# Altium footprint library std-th.PcbLib: 245 footprints (part 11 of 16)
Each footprint in its own frame and in the unit in brackets; x right, y up, seen from the top. Pads: shape width x height; smd on the part's side, far side on the other; paste and mask are expansions set on the pad; w line width, h text height; cw(c..) or ccw(c..) is an arc to the next point about the centre after c.
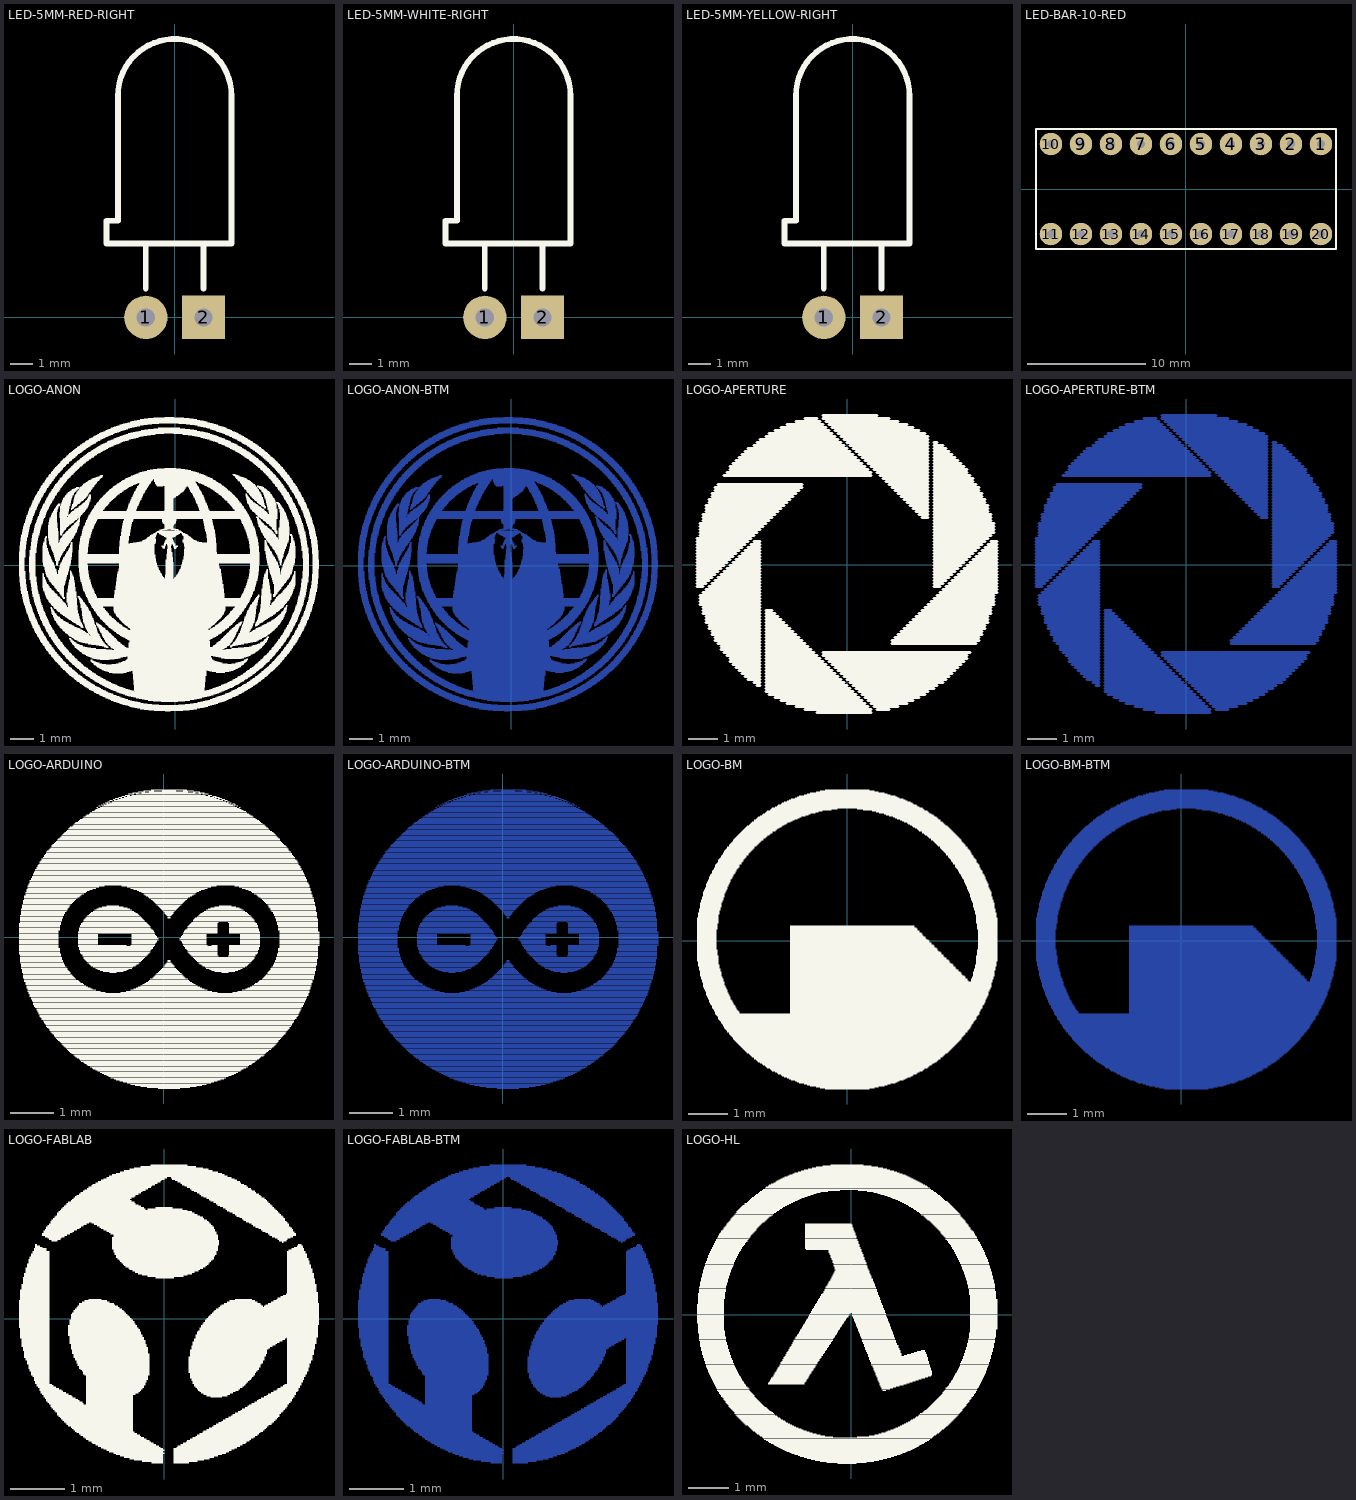
[diagram p10: the footprints below, top view; thin cyan lines are the x and y axes]

## LED-5MM-RED-RIGHT [mm] "LED, Red, 5 mm, 100 mil pitch, right angle"
height 6
pads (2):
  round 1.905 hole 0.8: 1(-1.27,0)
  rect 1.905x1.905 hole 0.8: 2(1.27,0)
Top Overlay:
  lines w0.254: -2.565,4.253 -3,4.253 -3,3.253 2.5,3.253 2.5,9.753 ccw(c0,9.753) -2.5,9.753 -2.5,4.253 ; -1.27,1.27 -1.27,3.253 ; 1.27,1.27 1.27,3.253
3D body: height 6.05, standoff -1.71, extent -3,-0.25 2.557,12.253

## LED-5MM-WHITE-RIGHT [mm] "LED, White, 5 mm, 100 mil pitch, right angle"
height 6
pads (2):
  round 1.905 hole 0.8: 1(-1.27,0)
  rect 1.905x1.905 hole 0.8: 2(1.27,0)
Top Overlay:
  lines w0.254: -2.565,4.253 -3,4.253 -3,3.253 2.5,3.253 2.5,9.753 ccw(c0,9.753) -2.5,9.753 -2.5,4.253 ; -1.27,1.27 -1.27,3.253 ; 1.27,1.27 1.27,3.253
3D body: height 6.05, standoff -1.71, extent -3,-0.25 2.557,12.253

## LED-5MM-YELLOW-RIGHT [mm] "LED, Yellow, 5 mm, 100 mil pitch, right angle"
height 6
pads (2):
  round 1.905 hole 0.8: 1(-1.27,0)
  rect 1.905x1.905 hole 0.8: 2(1.27,0)
Top Overlay:
  lines w0.254: -2.565,4.253 -3,4.253 -3,3.253 2.5,3.253 2.5,9.753 ccw(c0,9.753) -2.5,9.753 -2.5,4.253 ; -1.27,1.27 -1.27,3.253 ; 1.27,1.27 1.27,3.253
3D body: height 6.05, standoff -1.71, extent -3,-0.25 2.557,12.253

## LED-BAR-10-RED [mm] "LED Bar, 10 positions, 100 mil pitch"
height 10
pads (20):
  round 1.905 hole 0.7: 1(11.43,3.81) 2(8.89,3.81) 3(6.35,3.81) 4(3.81,3.81) 5(1.27,3.81) 6(-1.27,3.81) 7(-3.81,3.81) 8(-6.35,3.81) 9(-8.89,3.81) 10(-11.43,3.81) 11(-11.43,-3.81) 12(-8.89,-3.81) 13(-6.35,-3.81) 14(-3.81,-3.81) 15(-1.27,-3.81) 16(1.27,-3.81) 17(3.81,-3.81) 18(6.35,-3.81) 19(8.89,-3.81) 20(11.43,-3.81)
Top Overlay:
  lines w0.203: -12.7,-5.08 12.7,-5.08 12.7,5.08 -12.7,5.08 -12.7,-5.08
3D body: height 6.8, standoff -7, extent -12.7,-5.08 12.7,5.08

## LOGO-ANON [mil] "Anonymous Logo, 600 mil"
Top Overlay:
  drawing of 4671 lines, arcs and shapes, not listed

## LOGO-ANON-BTM [mil] "Anonymous Logo, 600 mil"
Bottom Layer:
  drawing of 4671 lines, arcs and shapes, not listed

## LOGO-APERTURE [mil] "Aperture Science Logo, 300 mil"
Top Overlay:
  drawing of 278 lines, arcs and shapes, not listed

## LOGO-APERTURE-BTM [mil] "Aperture Science Logo, 300 mil"
height 78.74
Bottom Layer:
  lines w4: -200,-29 -192,-29 ; -200,-25 -188,-25 ; -200,-21 -184,-21 ; -200,-17 -180,-17 ; -200,-13 -176,-13 ; -200,-9 -172,-9 ; -200,-5 -168,-5 ; -200,-1 -164,-1 ; -200,3 -160,3 ; -200,7 -156,7 ; -200,11 -152,11 ; -200,15 -148,15 ; -200,19 -144,19 ; -200,23 -140,23 ; -200,27 -136,27 ; -200,31 -132,31 ; -200,35 -128,35 ; -196,-53 -116,-53 ; -196,-49 -116,-49 ; -196,-45 -116,-45 ; -196,-41 -116,-41 ; -196,39 -124,39 ; -196,43 -120,43 ; -196,47 -116,47 ; -196,51 -112,51 ; -196,55 -108,55 ; -192,-65 -116,-65 ; -192,-61 -116,-61 ; -192,-57 -116,-57 ; -192,-37 -116,-37 ; -192,59 -104,59 ; -192,63 -100,63 ; -192,67 -96,67 ; -188,-77 -116,-77 ; -188,-73 -116,-73 ; -188,-69 -116,-69 ; -188,-33 -116,-33 ; -188,71 -92,71 ; -188,75 -88,75 ; -188,79 -84,79 ; -184,-85 -116,-85 ; -184,-81 -116,-81 ; -184,-29 -116,-29 ; -184,83 -80,83 ; -184,87 -76,87 ; -180,-93 -116,-93 ; -180,-89 -116,-89 ; -180,-25 -116,-25 ; -180,91 -72,91 ; -180,95 -68,95 ; -176,-101 -116,-101 ; -176,-97 -116,-97 ; -176,-21 -116,-21 ; -176,99 -64,99 ; -176,103 -60,103 ; -172,-105 -116,-105 ; -172,-17 -116,-17 ; -172,107 -60,107 ; -168,-113 -116,-113 ; -168,-109 -116,-109 ; -168,-13 -116,-13 ; -164,-117 -116,-117 ; -164,-9 -116,-9 ; -164,119 32,119 ; -160,-121 -116,-121 ; -160,-5 -116,-5 ; -160,123 32,123 ; -156,-129 -116,-129 ; -156,-125 -116,-125 ; -156,-1 -116,-1 ; -156,127 28,127 ; -156,131 24,131 ; -152,-133 -116,-133 ; -152,3 -116,3 ; -152,135 20,135 ; -148,-137 -116,-137 ; -148,7 -116,7 ; -148,139 16,139 ; -144,-141 -116,-141 ; -144,11 -116,11 ; -144,143 12,143 ; -140,-145 -116,-145 ; -140,15 -116,15 ; -140,147 8,147 ; -136,-149 -116,-149 ; -136,19 -116,19 ; -136,151 4,151 ; -132,-153 -116,-153 ; -132,23 -116,23 ; -132,155 0,155 ; -128,27 -116,27 ; -124,-157 -116,-157 ; -124,31 -116,31 ; -124,159 -4,159 ; -120,-161 -116,-161 ; -120,163 -8,163 ; -116,167 -12,167 ; -108,-169 8,-169 ; -108,-165 4,-165 ; -108,-161 0,-161 ; -108,-157 -4,-157 ; -108,-153 -8,-153 ; -108,-149 -12,-149 ; -108,-145 -16,-145 ; -108,-141 -20,-141 ; -108,-137 -24,-137 ; -108,-133 -28,-133 ; -108,-129 -32,-129 ; -108,-125 -36,-125 ; -108,-121 -40,-121 ; -108,-117 -44,-117 ; -108,-113 -48,-113 ; -108,-109 -52,-109 ; -108,-105 -56,-105 ; -108,-101 -60,-101 ; -108,-97 -64,-97 ; -108,-93 -68,-93 ; -108,-89 -72,-89 ; -108,-85 -76,-85 ; -108,-81 -80,-81 ; -108,-77 -84,-77 ; -108,-73 -88,-73 ; -108,-69 -92,-69 ; -108,-65 -96,-65 ; -108,-61 -100,-61 ; -108,171 -16,171 ; -104,-173 12,-173 ; -104,175 -20,175 ; -96,-177 16,-177 ; -96,179 -24,179 ; -88,-181 20,-181 ; -88,183 -28,183 ; -80,-185 24,-185 ; -80,187 -32,187 ; -68,-189 28,-189 ; -68,191 -36,191 ; -56,-193 32,-193 ; -56,195 -40,195 ; -40,-197 32,-197 ; -32,-121 160,-121 ; -32,-117 164,-117 ; -32,195 56,195 ; -32,199 40,199 ; -28,-125 160,-125 ; -28,191 68,191 ; -24,-129 156,-129 ; -24,187 80,187 ; -20,-133 152,-133 ; -20,183 88,183 ; -16,-137 148,-137 ; -16,179 96,179 ; -12,-141 144,-141 ; -12,175 104,175 ; -8,-145 140,-145 ; -8,171 108,171 ; -4,-149 136,-149 ; -4,167 108,167 ; 0,-153 132,-153 ; 0,163 108,163 ; 4,-157 128,-157 ; 4,159 108,159 ; 8,-161 120,-161 ; 8,155 108,155 ; 12,-165 116,-165 ; 12,151 108,151 ; 16,-169 108,-169 ; 16,147 108,147 ; 20,-173 104,-173 ; 20,143 108,143 ; 24,-177 96,-177 ; 24,139 108,139 ; 28,-181 88,-181 ; 28,135 108,135 ; 32,-185 80,-185 ; 32,131 108,131 ; 36,-189 68,-189 ; 36,127 108,127 ; 40,-193 56,-193 ; 40,123 108,123 ; 44,119 108,119 ; 48,115 108,115 ; 52,111 108,111 ; 56,107 108,107 ; 60,-105 172,-105 ; 60,-101 176,-101 ; 60,103 108,103 ; 64,-97 176,-97 ; 64,99 108,99 ; 68,-93 180,-93 ; 68,95 108,95 ; 72,-89 180,-89 ; 72,91 108,91 ; 76,-85 184,-85 ; 76,87 108,87 ; 80,-81 184,-81 ; 80,83 108,83 ; 84,-77 188,-77 ; 84,79 108,79 ; 88,-73 188,-73 ; 88,75 108,75 ; 92,-69 188,-69 ; 92,71 108,71 ; 96,-65 192,-65 ; 96,67 108,67 ; 100,-61 192,-61 ; 100,63 108,63 ; 104,-57 192,-57 ; 108,-53 196,-53 ; 112,-49 196,-49 ; 116,-45 196,-45 ; 116,-29 124,-29 ; 116,-25 128,-25 ; 116,-21 132,-21 ; 116,-17 136,-17 ; 116,-13 140,-13 ; 116,-9 144,-9 ; 116,-5 148,-5 ; 116,-1 152,-1 ; 116,3 156,3 ; 116,7 160,7 ; 116,11 164,11 ; 116,15 168,15 ; 116,19 172,19 ; 116,23 176,23 ; 116,27 180,27 ; 116,31 184,31 ; 116,35 188,35 ; 116,39 192,39 ; 116,43 196,43 ; 116,47 196,47 ; 116,51 196,51 ; 116,55 196,55 ; 116,59 192,59 ; 116,63 192,63 ; 116,67 192,67 ; 116,71 188,71 ; 116,75 188,75 ; 116,79 188,79 ; 116,83 184,83 ; 116,87 184,87 ; 116,91 180,91 ; 116,95 180,95 ; 116,99 176,99 ; 116,103 176,103 ; 116,107 172,107 ; 116,111 168,111 ; 116,115 168,115 ; 116,119 164,119 ; 116,123 160,123 ; 116,127 160,127 ; 116,131 156,131 ; 116,135 152,135 ; 116,139 148,139 ; 116,143 144,143 ; 116,147 140,147 ; 116,151 136,151 ; 116,155 132,155 ; 116,159 128,159 ; 116,163 120,163 ; 120,-41 196,-41 ; 124,-37 200,-37 ; 128,-33 200,-33 ; 132,-29 200,-29 ; 136,-25 200,-25 ; 140,-21 200,-21 ; 144,-17 200,-17 ; 148,-13 200,-13 ; 152,-9 200,-9 ; 156,-5 200,-5 ; 160,-1 200,-1 ; 164,3 200,3 ; 168,7 200,7 ; 172,11 200,11 ; 176,15 200,15 ; 180,19 200,19 ; 184,23 200,23 ; 188,27 200,27 ; 192,31 200,31

## LOGO-ARDUINO [mil] "Arduino Logo, 300 mil"
Top Overlay:
  drawing of 632 lines, arcs and shapes, not listed

## LOGO-ARDUINO-BTM [mil] "Arduino Logo, 300 mil"
Bottom Layer:
  lines w1: -132,-15 -94,-15 ; -132,-14 -95,-14 ; -132,-13 -95,-13 ; -132,-12 -95,-12 ; -132,-11 -95,-11 ; -132,-10 -95,-10 ; -132,-9 -96,-9 ; -132,-8 -96,-8 ; -132,-7 -96,-7 ; -132,-6 -96,-6 ; -132,-5 -96,-5 ; -132,-4 -96,-4 ; -132,-3 -96,-3 ; -132,-2 -96,-2 ; -132,-1 -96,-1 ; -132,0 -96,0 ; -132,1 -96,1 ; -132,2 -96,2 ; -132,3 -96,3 ; -132,4 -96,4 ; -132,5 -96,5 ; -132,6 -96,6 ; -132,7 -95,7 ; -132,8 -95,8 ; -132,9 -95,9 ; -132,10 -95,10 ; -132,11 -95,11 ; -132,12 -94,12 ; -132,13 -94,13 ; -131,-23 -91,-23 ; -131,-22 -92,-22 ; -131,-21 -92,-21 ; -131,-20 -93,-20 ; -131,-19 -93,-19 ; -131,-18 -93,-18 ; -131,-17 -94,-17 ; -131,-16 -94,-16 ; -131,14 -94,14 ; -131,15 -93,15 ; -131,16 -93,16 ; -131,17 -93,17 ; -131,18 -92,18 ; -131,19 -92,19 ; -131,20 -91,20 ; -130,-28 -88,-28 ; -130,-27 -89,-27 ; -130,-26 -90,-26 ; -130,-25 -90,-25 ; -130,-24 -91,-24 ; -130,21 -91,21 ; -130,22 -90,22 ; -130,23 -90,23 ; -130,24 -89,24 ; -130,25 -88,25 ; -130,26 -88,26 ; -129,-32 -85,-32 ; -129,-31 -86,-31 ; -129,-30 -87,-30 ; -129,-29 -88,-29 ; -129,27 -87,27 ; -129,28 -86,28 ; -129,29 -86,29 ; -129,30 -85,30 ; -128,-37 -81,-37 ; -128,-36 -82,-36 ; -128,-35 -83,-35 ; -128,-34 -84,-34 ; -128,-33 -85,-33 ; -128,31 -84,31 ; -128,32 -83,32 ; -128,33 -82,33 ; -128,34 -81,34 ; -127,-40 -77,-40 ; -127,-39 -78,-39 ; -127,-38 -80,-38 ; -127,35 -80,35 ; -127,36 -79,36 ; -127,37 -77,37 ; -127,38 -76,38 ; -126,-43 -73,-43 ; -126,-42 -74,-42 ; -126,-41 -76,-41 ; -126,39 -75,39 ; -126,40 -73,40 ; -126,41 -71,41 ; -125,-46 -67,-46 ; -125,-45 -69,-45 ; -125,-44 -71,-44 ; -125,42 -70,42 ; -125,43 -68,43 ; -125,44 -65,44 ; -124,-49 -58,-49 ; -124,-48 -62,-48 ; -124,-47 -65,-47 ; -124,45 -62,45 ; -124,46 -59,46 ; -124,47 -54,47 ; -123,-51 132,-51 ; -123,-50 -53,-50 ; -123,48 133,48 ; -123,49 132,49 ; -122,-54 131,-54 ; -122,-53 132,-53 ; -122,-52 132,-52 ; -122,50 132,50 ; -122,51 131,51 ; -122,52 131,52 ; -121,-56 130,-56 ; -121,-55 131,-55 ; -121,53 131,53 ; -121,54 130,54 ; -120,-58 129,-58 ; -120,-57 130,-57 ; -120,55 130,55 ; -120,56 129,56 ; -119,-61 128,-61 ; -119,-60 128,-60 ; -119,-59 129,-59 ; -119,57 129,57 ; -119,58 128,58 ; -118,-63 127,-63 ; -118,-62 127,-62 ; -118,59 128,59 ; -118,60 127,60 ; -117,-64 126,-64 ; -117,61 127,61 ; -117,62 126,62 ; -116,-66 125,-66 ; -116,-65 126,-65 ; -116,63 126,63 ; -116,64 125,64 ; -115,-68 124,-68 ; -115,-67 125,-67 ; -115,65 125,65 ; -115,66 124,66 ; -114,-70 123,-70 ; -114,-69 124,-69 ; -114,67 123,67 ; -113,-72 122,-72 ; -113,-71 123,-71 ; -113,68 123,68 ; -113,69 122,69 ; -112,-73 121,-73 ; -112,70 122,70 ; -111,-75 120,-75 ; -111,-74 121,-74 ; -111,71 121,71 ; -111,72 120,72 ; -110,-76 119,-76 ; -110,73 120,73 ; -109,-78 118,-78 ; -109,-77 119,-77 ; -109,74 119,74 ; -109,75 118,75 ; -108,-79 117,-79 ; -108,76 117,76 ; -107,-81 116,-81 ; -107,-80 117,-80 ; -107,77 117,77 ; -107,78 116,78 ; -106,-82 115,-82 ; -106,79 115,79 ; -105,-83 115,-83 ; -105,80 114,80 ; -104,-85 113,-85 ; -104,-84 114,-84 ; -104,81 114,81 ; -103,-86 112,-86 ; -103,82 113,82 ; -102,-87 111,-87 ; -102,83 112,83 ; -102,84 111,84 ; -101,-88 111,-88 ; -101,85 110,85 ; -100,-90 109,-90 ; -100,-89 110,-89 ; -100,86 109,86 ; -99,-91 108,-91 ; -99,87 108,87 ; -98,-92 107,-92 ; -98,88 107,88 ; -97,-93 106,-93 ; -97,89 106,89 ; -96,-94 105,-94 ; -96,90 106,90 ; -95,-95 105,-95 ; -95,91 105,91 ; -94,-96 104,-96 ; -94,92 104,92 ; -93,-97 103,-97 ; -93,93 103,93 ; -92,-98 102,-98 ; -92,94 102,94 ; -91,-99 101,-99 ; -91,95 101,95 ; -90,-100 100,-100 ; -90,96 100,96 ; -89,-101 99,-101 ; -89,97 99,97 ; -88,-102 98,-102 ; -88,98 97,98 ; -87,-103 96,-103 ; -87,99 96,99 ; -86,-104 95,-104 ; -86,100 95,100 ; -85,-105 94,-105 ; -85,101 94,101 ; -84,-106 93,-106 ; -83,102 93,102 ; -82,-107 92,-107 ; -82,103 92,103 ; -81,-108 91,-108 ; -81,104 90,104 ; -80,-109 89,-109 ; -80,105 89,105 ; -79,-110 88,-110 ; -78,-8 -9,-8 ; -78,-7 -34,-7 ; -78,-6 -60,-6 ; -78,-5 -60,-5 ; -78,-4 -60,-4 ; -78,-3 -60,-3 ; -78,-2 -60,-2 ; -78,-1 -60,-1 ; -78,0 -60,0 ; -78,1 -60,1 ; -78,2 -60,2 ; -78,3 -60,3 ; -78,4 -8,4 ; -78,5 -9,5 ; -78,106 88,106 ; -77,-111 87,-111 ; -77,-11 -11,-11 ; -77,-10 -10,-10 ; -77,-9 -10,-9 ; -77,6 -9,6 ; -77,7 -10,7 ; -77,8 -11,8 ; -77,9 -12,9 ; -77,107 87,107 ; -76,-112 85,-112 ; -76,-14 -13,-14 ; -76,-13 -12,-13 ; -76,-12 -12,-12 ; -76,10 -12,10 ; -76,11 -13,11 ; -76,108 85,108 ; -75,-113 84,-113 ; -75,-15 -14,-15 ; -75,12 -14,12 ; -75,13 -15,13 ; -74,-17 -16,-17 ; -74,-16 -15,-16 ; -74,14 -16,14 ; -74,109 84,109 ; -73,-114 83,-114 ; -73,-19 -18,-19 ; -73,-18 -17,-18 ; -73,15 -17,15 ; -73,16 -18,16 ; -73,110 82,110 ; -72,-115 81,-115 ; -72,-20 -19,-20 ; -72,17 -19,17 ; -71,-21 -20,-21 ; -71,18 -20,18 ; -71,111 81,111 ; -70,-116 80,-116 ; -70,-22 -21,-22 ; -70,19 -21,19 ; -70,112 79,112 ; -69,-117 78,-117 ; -69,-23 -22,-23 ; -69,20 -22,20 ; -68,-24 -23,-24 ; -68,21 -23,21 ; -68,113 78,113 ; -67,-118 77,-118 ; -67,-25 -25,-25 ; -67,22 -24,22 ; -67,114 76,114 ; -66,-26 -26,-26 ; -66,23 -26,23 ; -65,-119 75,-119 ; -65,115 75,115 ; -64,-120 73,-120 ; -64,-27 -28,-27 ; -64,24 -27,24 ; -63,25 -29,25 ; -63,116 73,116 ; -62,-121 71,-121 ; -62,-28 -29,-28 ; -62,117 71,117 ; -61,26 -31,26 ; -61,119 -60,119 ; -60,-122 70,-122 ; -60,-29 -32,-29 ; -60,118 69,118 ; -59,27 -33,27 ; -59,120 -58,120 ; -58,-123 68,-123 ; -58,-30 -34,-30 ; -58,119 67,119 ; -57,121 -56,121 ; -56,-124 66,-124 ; -56,28 -37,28 ; -56,120 65,120 ; -55,-31 -37,-31 ; -55,122 -54,122 ; -54,-125 64,-125 ; -54,121 63,121 ; -53,123 -51,123 ; -52,-126 62,-126 ; -52,29 -41,29 ; -52,122 61,122 ; -51,124 -49,124 ; -50,-127 59,-127 ; -49,-32 -43,-32 ; -49,123 59,123 ; -49,125 -47,125 ; -48,-128 57,-128 ; -47,124 57,124 ; -46,126 -44,126 ; -45,-129 55,-129 ; -45,125 54,125 ; -44,127 -41,127 ; -43,-130 52,-130 ; -42,126 51,126 ; -41,128 -38,128 ; -40,-131 49,-131 ; -39,-50 49,-50 ; -39,127 48,127 ; -38,47 48,47 ; -38,129 -35,129 ; -37,-132 46,-132 ; -36,128 46,128 ; -35,130 -31,130 ; -34,-49 44,-49 ; -33,-133 43,-133 ; -33,46 43,46 ; -33,129 42,129 ; -32,131 -27,131 ; -30,-134 39,-134 ; -30,-48 40,-48 ; -30,-7 -8,-7 ; -30,45 40,45 ; -29,-6 -8,-6 ; -29,-5 -7,-5 ; -29,-4 -6,-4 ; -29,-3 -6,-3 ; -29,-2 -5,-2 ; -29,-1 -5,-1 ; -29,0 -6,0 ; -29,1 -6,1 ; -29,2 -7,2 ; -29,3 -8,3 ; -29,130 38,130 ; -28,132 -23,132 ; -27,-47 37,-47 ; -27,44 37,44 ; -26,-135 35,-135 ; -25,-46 35,-46 ; -25,131 34,131 ; -24,43 34,43 ; -23,-45 33,-45 ; -23,133 -17,133 ; -22,42 32,42 ; -21,-136 30,-136 ; -21,-44 31,-44 ; -20,41 30,41 ; -20,132 29,132 ; -19,-43 29,-43 ; -18,40 29,40 ; -18,134 -9,134 ; -17,-42 27,-42 ; -17,39 27,39 ; -16,-41 26,-41 ; -16,38 26,38 ; -15,-137 24,-137 ; -14,-40 24,-40 ; -14,37 24,37 ; -13,-39 23,-39 ; -13,36 22,36 ; -13,133 22,133 ; -12,-38 22,-38 ; -11,35 21,35 ; -11,135 21,135 ; -10,-37 20,-37 ; -10,34 20,34 ; -9,-36 19,-36 ; -9,33 19,33 ; -8,-35 18,-35 ; -8,32 18,32 ; -7,-34 17,-34 ; -7,31 17,31 ; -6,-33 16,-33 ; -6,30 16,30 ; -5,-138 15,-138 ; -5,-32 15,-32 ; -5,29 15,29 ; -4,-31 14,-31 ; -4,28 14,28 ; -3,-30 13,-30 ; -3,27 13,27 ; -2,-29 12,-29 ; -2,26 12,26 ; -1,-28 11,-28 ; -1,25 11,25 ; -1,134 11,134 ; 0,-27 10,-27 ; 0,24 10,24 ; 1,-26 10,-26 ; 1,-25 9,-25 ; 1,22 9,22 ; 1,23 9,23 ; 2,-24 8,-24 ; 2,21 8,21 ; 3,-23 7,-23 ; 3,20 7,20 ; 4,-22 6,-22 ; 4,-21 6,-21 ; 4,18 6,18 ; 4,19 6,19 ; 15,-2 39,-2 ; 15,-1 39,-1 ; 16,-3 39,-3 ; 16,0 39,0 ; 16,1 39,1 ; 17,-5 39,-5 ; 17,-4 39,-4 ; 17,2 39,2 ; 18,-7 40,-7 ; 18,-6 39,-6 ; 18,3 39,3 ; 18,4 49,4 ; 18,134 27,134 ; 19,-8 49,-8 ; 19,5 49,5 ; 19,6 49,6 ; 20,-10 49,-10 ; 20,-9 49,-9 ; 20,7 49,7 ; 21,-11 49,-11 ; 21,8 49,8 ; 22,-13 49,-13 ; 22,-12 49,-12 ; 22,9 49,9 ; 22,10 49,10 ; 23,-14 49,-14 ; 23,11 49,11 ; 24,-15 49,-15 ; 24,12 49,12 ; 25,-16 49,-16 ; 25,13 49,13 ; 26,-17 50,-17 ; 26,14 50,14 ; 27,-18 83,-18 ; 27,15 83,15 ; 27,16 83,16 ; 27,133 33,133 ; 28,-19 83,-19 ; 28,17 82,17 ; 29,-20 82,-20 ; 29,18 81,18 ; 30,-21 81,-21 ; 31,-22 80,-22 ; 31,19 80,19 ; 32,-23 79,-23 ; 32,20 79,20 ; 32,132 37,132 ; 33,-24 78,-24 ; 33,21 78,21 ; 34,22 77,22 ; 35,-25 77,-25 ; 36,-26 76,-26 ; 36,23 76,23 ; 36,131 41,131 ; 37,24 74,24 ; 38,-27 74,-27 ; 39,-28 72,-28 ; 39,25 73,25 ; 41,26 71,26 ; 41,130 44,130 ; 42,-29 70,-29 ; 43,27 69,27 ; 44,-30 68,-30 ; 44,-7 49,-7 ; 45,129 48,129 ; 47,-31 65,-31 ; 47,28 66,28 ; 47,128 51,128 ; 50,127 53,127 ; 51,29 62,29 ; 53,-32 59,-32 ; 53,126 56,126 ; 56,125 58,125 ; 58,124 60,124 ; 59,-17 84,-17 ; 59,14 84,14 ; 60,-16 84,-16 ; 60,-15 85,-15 ; 60,-14 86,-14 ; 60,-13 86,-13 ; 60,-12 86,-12 ; 60,-11 87,-11 ; 60,-10 87,-10 ; 60,-9 87,-9 ; 60,-8 88,-8 ; 60,-7 88,-7 ; 60,4 88,4 ; 60,5 88,5 ; 60,6 87,6 ; 60,7 87,7 ; 60,8 87,8 ; 60,9 86,9 ; 60,10 86,10 ; 60,11 86,11 ; 60,12 85,12 ; 60,13 85,13 ; 61,123 62,123 ; 63,-50 133,-50 ; 63,122 65,122 ; 65,47 133,47 ; 65,121 66,121 ; 67,120 68,120 ; 68,-49 133,-49 ; 69,46 133,46 ; 69,119 70,119 ; 70,-6 88,-6 ; 70,-5 88,-5 ; 70,-4 88,-4 ; 70,-3 88,-3 ; 70,-2 88,-2 ; 70,-1 88,-1 ; 70,0 88,0 ; 70,1 88,1 ; 70,2 88,2 ; 70,3 88,3 ; 72,-48 133,-48 ; 72,45 134,45 ; 75,-47 134,-47 ; 75,44 134,44 ; 77,-46 134,-46 ; 78,43 134,43 ; 79,-45 134,-45 ; 80,42 135,42 ; 81,-44 135,-44 ; 81,41 135,41 ; 83,-43 135,-43 ; 83,40 135,40 ; 84,-42 135,-42 ; 85,39 136,39 ; 86,-41 136,-41 ; 86,38 136,38 ; 87,-40 136,-40 ; 87,37 136,37 ; 88,-39 136,-39 ; 89,36 137,36 ; 90,-38 137,-38 ; 90,35 137,35 ; 91,-37 137,-37 ; 91,34 137,34 ; 92,-36 137,-36 ; 92,33 137,33 ; 93,-35 137,-35 ; 93,32 138,32 ; 94,-34 138,-34 ; 94,31 138,31 ; 95,-33 138,-33 ; 95,-32 138,-32 ; 95,30 138,30 ; 96,-31 138,-31 ; 96,28 139,28 ; 96,29 138,29 ; 97,-30 139,-30 ; 97,27 139,27 ; 98,-29 139,-29 ; 98,-28 139,-28 ; 98,25 139,25 ; 98,26 139,26 ; 99,-27 139,-27 ; 99,24 139,24 ; 100,-26 139,-26 ; 100,-25 140,-25 ; 100,22 140,22 ; 100,23 140,23 ; 101,-24 140,-24 ; 101,-23 140,-23 ; 101,20 140,20 ; 101,21 140,21 ; 102,-22 140,-22 ; 102,-21 140,-21 ; 102,18 140,18 ; 102,19 140,19 ; 103,-20 140,-20 ; 103,-19 141,-19 ; 103,-18 141,-18 ; 103,15 141,15 ; 103,16 141,16 ; 103,17 141,17 ; 104,-17 141,-17 ; 104,-16 141,-16 ; 104,-15 141,-15 ; 104,12 141,12 ; 104,13 141,13 ; 104,14 141,14 ; 105,-14 141,-14 ; 105,-13 141,-13 ; 105,-12 141,-12 ; 105,-11 141,-11 ; 105,-10 141,-10 ; 105,7 141,7 ; 105,8 141,8 ; 105,9 141,9 ; 105,10 141,10 ; 105,11 141,11 ; 106,-9 141,-9 ; 106,-8 141,-8 ; 106,-7 142,-7 ; 106,-6 142,-6 ; 106,-5 142,-5 ; 106,-4 142,-4 ; 106,-3 142,-3 ; 106,-2 142,-2 ; 106,-1 142,-1 ; 106,0 142,0 ; 106,1 142,1 ; 106,2 142,2 ; 106,3 142,3 ; 106,4 142,4 ; 106,5 142,5 ; 106,6 141,6

## LOGO-BM [mil] "Black Mesa Logo, 300 mil"
Top Overlay:
  drawing of 561 lines, arcs and shapes, not listed

## LOGO-BM-BTM [mil] "Black Mesa Logo, 300 mil"
Bottom Layer:
  lines w1: -145,-20 -124,-20 ; -145,-19 -124,-19 ; -145,-18 -124,-18 ; -145,-17 -124,-17 ; -145,-16 -124,-16 ; -145,-15 -124,-15 ; -145,-14 -125,-14 ; -145,-13 -125,-13 ; -145,-12 -125,-12 ; -145,-11 -125,-11 ; -145,-10 -125,-10 ; -145,-9 -125,-9 ; -145,-8 -126,-8 ; -145,-7 -126,-7 ; -145,-6 -126,-6 ; -145,-5 -126,-5 ; -145,-4 -126,-4 ; -145,-3 -126,-3 ; -145,-2 -126,-2 ; -145,-1 -126,-1 ; -145,0 -126,0 ; -145,1 -126,1 ; -145,2 -126,2 ; -145,3 -126,3 ; -145,4 -126,4 ; -145,5 -126,5 ; -145,6 -126,6 ; -145,7 -126,7 ; -145,8 -126,8 ; -145,9 -126,9 ; -145,10 -126,10 ; -145,11 -126,11 ; -145,12 -125,12 ; -145,13 -125,13 ; -145,14 -125,14 ; -145,15 -125,15 ; -145,16 -125,16 ; -145,17 -125,17 ; -145,18 -124,18 ; -145,19 -124,19 ; -145,20 -124,20 ; -145,21 -124,21 ; -145,22 -124,22 ; -145,23 -124,23 ; -144,-25 -123,-25 ; -144,-24 -123,-24 ; -144,-23 -124,-23 ; -144,-22 -124,-22 ; -144,-21 -124,-21 ; -144,24 -124,24 ; -144,25 -124,25 ; -144,26 -124,26 ; -144,27 -123,27 ; -144,28 -123,28 ; -143,-29 -122,-29 ; -143,-28 -122,-28 ; -143,-27 -123,-27 ; -143,-26 -123,-26 ; -143,29 -123,29 ; -143,30 -123,30 ; -143,31 -122,31 ; -143,32 -122,32 ; -142,-35 -121,-35 ; -142,-34 -121,-34 ; -142,-33 -121,-33 ; -142,-32 -121,-32 ; -142,-31 -121,-31 ; -142,-30 -122,-30 ; -142,33 -122,33 ; -142,34 -121,34 ; -142,35 -121,35 ; -142,36 -121,36 ; -142,37 -121,37 ; -142,38 -121,38 ; -141,-38 -119,-38 ; -141,-37 -120,-37 ; -141,-36 -120,-36 ; -141,39 -120,39 ; -141,40 -120,40 ; -141,41 -119,41 ; -140,-41 -118,-41 ; -140,-40 -119,-40 ; -140,-39 -119,-39 ; -140,42 -119,42 ; -140,43 -119,43 ; -140,44 -118,44 ; -139,-46 -117,-46 ; -139,-45 -117,-45 ; -139,-44 -118,-44 ; -139,-43 -118,-43 ; -139,-42 -118,-42 ; -139,45 -118,45 ; -139,46 -118,46 ; -139,47 -118,47 ; -139,48 -117,48 ; -139,49 -117,49 ; -138,-48 -116,-48 ; -138,-47 -116,-47 ; -138,50 -116,50 ; -138,51 -116,51 ; -137,-50 -115,-50 ; -137,-49 -115,-49 ; -137,52 -115,52 ; -137,53 -115,53 ; -136,-54 -113,-54 ; -136,-53 -114,-53 ; -136,-52 -114,-52 ; -136,-51 -115,-51 ; -136,54 -115,54 ; -136,55 -114,55 ; -136,56 -114,56 ; -136,57 -113,57 ; -135,-56 -112,-56 ; -135,-55 -113,-55 ; -135,58 -113,58 ; -135,59 -112,59 ; -134,-58 -112,-58 ; -134,-57 -112,-57 ; -134,60 -112,60 ; -134,61 -112,61 ; -133,-61 -110,-61 ; -133,-60 -110,-60 ; -133,-59 -111,-59 ; -133,62 -111,62 ; -133,63 -110,63 ; -133,64 -110,64 ; -132,-63 -109,-63 ; -132,-62 -109,-62 ; -132,65 -109,65 ; -132,66 -109,66 ; -131,-64 -108,-64 ; -131,67 -108,67 ; -130,-67 -106,-67 ; -130,-66 -107,-66 ; -130,-65 -107,-65 ; -130,68 -107,68 ; -130,69 -107,69 ; -130,70 -106,70 ; -129,-68 -106,-68 ; -129,71 -106,71 ; -128,-70 -104,-70 ; -128,-69 -105,-69 ; -128,72 -105,72 ; -128,73 -104,73 ; -127,-73 137,-73 ; -127,-72 -103,-72 ; -127,-71 -103,-71 ; -127,74 -103,74 ; -127,75 -103,75 ; -127,76 -103,76 ; -126,-74 136,-74 ; -126,77 -101,77 ; -125,-75 135,-75 ; -125,78 -101,78 ; -124,-78 134,-78 ; -124,-77 134,-77 ; -124,-76 134,-76 ; -124,79 -100,79 ; -124,80 -99,80 ; -124,81 -99,81 ; -123,-79 133,-79 ; -123,82 -98,82 ; -122,-80 132,-80 ; -122,83 -97,83 ; -121,-82 131,-82 ; -121,-81 131,-81 ; -121,84 -96,84 ; -121,85 -96,85 ; -120,-83 130,-83 ; -120,86 -94,86 ; -119,-85 129,-85 ; -119,-84 129,-84 ; -119,87 -94,87 ; -119,88 -93,88 ; -118,-87 128,-87 ; -118,-86 128,-86 ; -118,89 -92,89 ; -118,90 -91,90 ; -117,-88 127,-88 ; -117,91 -90,91 ; -116,-89 126,-89 ; -116,92 -89,92 ; -115,-91 125,-91 ; -115,-90 125,-90 ; -115,93 -88,93 ; -115,94 -88,94 ; -113,-93 123,-93 ; -113,-92 123,-92 ; -113,95 -86,95 ; -113,96 -85,96 ; -112,-94 122,-94 ; -112,97 -84,97 ; -111,-95 121,-95 ; -111,98 -83,98 ; -110,-96 120,-96 ; -110,99 -82,99 ; -109,-98 119,-98 ; -109,-97 119,-97 ; -109,100 -81,100 ; -109,101 -79,101 ; -108,-99 118,-99 ; -108,102 -79,102 ; -107,-100 117,-100 ; -107,103 -77,103 ; -106,-101 116,-101 ; -106,104 -76,104 ; -105,-102 115,-102 ; -105,105 -75,105 ; -104,-103 114,-103 ; -104,106 -73,106 ; -103,-104 113,-104 ; -103,107 -72,107 ; -102,-105 112,-105 ; -102,108 -70,108 ; -101,-106 111,-106 ; -101,109 -70,109 ; -100,-107 110,-107 ; -100,110 -67,110 ; -99,-108 109,-108 ; -99,111 -66,111 ; -98,-109 108,-109 ; -98,112 -65,112 ; -97,-110 107,-110 ; -97,113 -63,113 ; -96,-111 106,-111 ; -96,114 -61,114 ; -95,-112 105,-112 ; -95,115 -60,115 ; -93,-113 103,-113 ; -93,116 -58,116 ; -92,-114 102,-114 ; -92,117 -56,117 ; -91,-115 101,-115 ; -91,118 -55,118 ; -90,-116 100,-116 ; -90,119 -52,119 ; -88,-118 98,-118 ; -88,-117 98,-117 ; -88,120 -50,120 ; -88,121 -48,121 ; -86,-119 96,-119 ; -86,122 -45,122 ; -85,-120 95,-120 ; -85,123 -43,123 ; -84,-121 94,-121 ; -84,124 -41,124 ; -82,-122 92,-122 ; -82,125 -37,125 ; -80,-123 90,-123 ; -80,126 -34,126 ; -79,-124 89,-124 ; -79,127 -32,127 ; -77,-125 87,-125 ; -77,128 -27,128 ; -76,-126 86,-126 ; -76,129 -24,129 ; -75,-127 85,-127 ; -75,130 -20,130 ; -72,-128 82,-128 ; -72,131 -11,131 ; -71,-129 81,-129 ; -71,132 -5,132 ; -70,-130 80,-130 ; -70,133 80,133 ; -67,-131 77,-131 ; -67,134 77,134 ; -65,-132 75,-132 ; -65,135 75,135 ; -64,-133 74,-133 ; -64,136 74,136 ; -61,-134 71,-134 ; -61,137 71,137 ; -60,-135 70,-135 ; -60,138 70,138 ; -58,-136 68,-136 ; -58,139 68,139 ; -55,-137 65,-137 ; -55,140 65,140 ; -53,-138 63,-138 ; -53,141 63,141 ; -52,-72 137,-72 ; -52,-71 137,-71 ; -52,-70 138,-70 ; -52,-69 138,-69 ; -52,-68 139,-68 ; -52,-67 140,-67 ; -52,-66 140,-66 ; -52,-65 140,-65 ; -52,-64 141,-64 ; -52,-63 142,-63 ; -52,-62 142,-62 ; -52,-61 143,-61 ; -52,-60 143,-60 ; -52,-59 143,-59 ; -52,-58 144,-58 ; -52,-57 144,-57 ; -52,-56 145,-56 ; -52,-55 145,-55 ; -52,-54 146,-54 ; -52,-53 146,-53 ; -52,-52 146,-52 ; -52,-51 146,-51 ; -52,-50 147,-50 ; -52,-49 147,-49 ; -52,-48 148,-48 ; -52,-47 148,-47 ; -52,-46 149,-46 ; -52,-45 149,-45 ; -52,-44 149,-44 ; -52,-43 149,-43 ; -52,-42 149,-42 ; -52,-41 150,-41 ; -52,-40 126,-40 ; -52,-39 125,-39 ; -52,-38 125,-38 ; -52,-37 123,-37 ; -52,-36 123,-36 ; -52,-35 122,-35 ; -52,-34 120,-34 ; -52,-33 119,-33 ; -52,-32 119,-32 ; -52,-31 118,-31 ; -52,-30 116,-30 ; -52,-29 116,-29 ; -52,-28 114,-28 ; -52,-27 113,-27 ; -52,-26 113,-26 ; -52,-25 111,-25 ; -52,-24 111,-24 ; -52,-23 110,-23 ; -52,-22 108,-22 ; -52,-21 107,-21 ; -52,-20 107,-20 ; -52,-19 106,-19 ; -52,-18 104,-18 ; -52,-17 104,-17 ; -52,-16 102,-16 ; -52,-15 101,-15 ; -52,-14 101,-14 ; -52,-13 99,-13 ; -52,-12 99,-12 ; -52,-11 98,-11 ; -52,-10 96,-10 ; -52,-9 95,-9 ; -52,-8 95,-8 ; -52,-7 94,-7 ; -52,-6 92,-6 ; -52,-5 92,-5 ; -52,-4 91,-4 ; -52,-3 89,-3 ; -52,-2 89,-2 ; -52,-1 87,-1 ; -52,0 87,0 ; -52,1 86,1 ; -52,2 84,2 ; -52,3 83,3 ; -52,4 83,4 ; -52,5 81,5 ; -52,6 80,6 ; -52,7 80,7 ; -52,8 79,8 ; -52,9 77,9 ; -52,10 77,10 ; -52,11 75,11 ; -52,12 75,12 ; -52,13 74,13 ; -52,14 72,14 ; -52,15 72,15 ; -51,-139 61,-139 ; -51,142 61,142 ; -47,-140 57,-140 ; -47,143 57,143 ; -45,-141 55,-141 ; -45,144 55,144 ; -43,-142 53,-142 ; -43,145 53,145 ; -38,-143 48,-143 ; -38,146 48,146 ; -35,-144 45,-144 ; -35,147 45,147 ; -32,-145 42,-145 ; -32,148 42,148 ; -26,-146 36,-146 ; -26,149 36,149 ; -22,-147 32,-147 ; -22,150 32,150 ; -17,-148 27,-148 ; -17,151 27,151 ; 15,132 81,132 ; 21,131 82,131 ; 30,130 85,130 ; 34,129 86,129 ; 37,128 87,128 ; 42,127 89,127 ; 44,126 91,126 ; 47,125 92,125 ; 51,124 94,124 ; 53,123 95,123 ; 55,122 96,122 ; 58,121 98,121 ; 60,120 98,120 ; 62,119 100,119 ; 65,118 101,118 ; 66,117 102,117 ; 68,116 103,116 ; 70,115 105,115 ; 71,114 106,114 ; 73,113 107,113 ; 75,112 108,112 ; 76,111 109,111 ; 77,110 110,110 ; 80,108 112,108 ; 80,109 111,109 ; 82,107 113,107 ; 83,106 114,106 ; 85,105 115,105 ; 86,104 116,104 ; 87,103 117,103 ; 89,101 119,101 ; 89,102 118,102 ; 91,100 119,100 ; 92,99 120,99 ; 93,98 121,98 ; 94,97 122,97 ; 95,96 123,96 ; 96,95 123,95 ; 98,93 125,93 ; 98,94 125,94 ; 99,92 126,92 ; 100,91 127,91 ; 101,90 128,90 ; 102,89 128,89 ; 103,88 129,88 ; 104,86 130,86 ; 104,87 129,87 ; 106,84 131,84 ; 106,85 131,85 ; 107,83 132,83 ; 108,82 133,82 ; 109,80 134,80 ; 109,81 134,81 ; 110,79 134,79 ; 111,77 136,77 ; 111,78 135,78 ; 113,74 137,74 ; 113,75 137,75 ; 113,76 137,76 ; 114,73 138,73 ; 115,72 138,72 ; 116,70 140,70 ; 116,71 139,71 ; 117,68 140,68 ; 117,69 140,69 ; 118,67 141,67 ; 119,65 142,65 ; 119,66 142,66 ; 120,63 143,63 ; 120,64 143,64 ; 121,62 143,62 ; 122,59 145,59 ; 122,60 144,60 ; 122,61 144,61 ; 123,57 146,57 ; 123,58 145,58 ; 124,55 146,55 ; 124,56 146,56 ; 125,52 147,52 ; 125,53 147,53 ; 125,54 146,54 ; 126,50 148,50 ; 126,51 148,51 ; 127,48 149,48 ; 127,49 149,49 ; 128,44 150,44 ; 128,45 149,45 ; 128,46 149,46 ; 128,47 149,47 ; 129,-40 150,-40 ; 129,-39 150,-39 ; 129,-38 151,-38 ; 129,41 151,41 ; 129,42 150,42 ; 129,43 150,43 ; 130,-37 151,-37 ; 130,-36 151,-36 ; 130,39 151,39 ; 130,40 151,40 ; 131,-35 152,-35 ; 131,-34 152,-34 ; 131,-33 152,-33 ; 131,-32 152,-32 ; 131,-31 152,-31 ; 131,34 152,34 ; 131,35 152,35 ; 131,36 152,36 ; 131,37 152,37 ; 131,38 152,38 ; 132,-30 152,-30 ; 132,-29 153,-29 ; 132,-28 153,-28 ; 132,31 153,31 ; 132,32 153,32 ; 132,33 152,33 ; 133,-27 153,-27 ; 133,-26 153,-26 ; 133,-25 154,-25 ; 133,-24 154,-24 ; 133,27 154,27 ; 133,28 154,28 ; 133,29 153,29 ; 133,30 153,30 ; 134,-23 154,-23 ; 134,-22 154,-22 ; 134,-21 154,-21 ; 134,-20 155,-20 ; 134,-19 155,-19 ; 134,-18 155,-18 ; 134,-17 155,-17 ; 134,-16 155,-16 ; 134,-15 155,-15 ; 134,18 155,18 ; 134,19 155,19 ; 134,20 155,20 ; 134,21 155,21 ; 134,22 155,22 ; 134,23 155,23 ; 134,24 154,24 ; 134,25 154,25 ; 134,26 154,26 ; 135,-14 155,-14 ; 135,-13 155,-13 ; 135,-12 155,-12 ; 135,-11 155,-11 ; 135,-10 155,-10 ; 135,-9 155,-9 ; 135,12 155,12 ; 135,13 155,13 ; 135,14 155,14 ; 135,15 155,15 ; 135,16 155,16 ; 135,17 155,17 ; 136,-8 155,-8 ; 136,-7 155,-7 ; 136,-6 155,-6 ; 136,-5 155,-5 ; 136,-4 155,-4 ; 136,-3 155,-3 ; 136,-2 155,-2 ; 136,-1 155,-1 ; 136,0 155,0 ; 136,1 155,1 ; 136,2 155,2 ; 136,3 155,3 ; 136,4 155,4 ; 136,5 155,5 ; 136,6 155,6 ; 136,7 155,7 ; 136,8 155,8 ; 136,9 155,9 ; 136,10 155,10 ; 136,11 155,11

## LOGO-FABLAB [mil] "Fablab Logo, 225 mil"
Top Overlay:
  drawing of 594 lines, arcs and shapes, not listed

## LOGO-FABLAB-BTM [mil] "Fablab Logo, 225 mil"
Bottom Layer:
  lines w1: -106,-6 -84,-6 ; -106,-5 -84,-5 ; -106,-4 -84,-4 ; -106,-3 -84,-3 ; -106,-2 -84,-2 ; -106,-1 -84,-1 ; -106,0 -84,0 ; -106,1 -84,1 ; -106,2 -84,2 ; -106,3 -84,3 ; -106,4 -84,4 ; -106,5 -84,5 ; -106,6 -84,6 ; -106,7 -84,7 ; -106,8 -84,8 ; -106,9 -84,9 ; -106,10 -84,10 ; -106,11 -84,11 ; -106,12 -84,12 ; -106,13 -84,13 ; -105,-14 -84,-14 ; -105,-13 -84,-13 ; -105,-12 -84,-12 ; -105,-11 -84,-11 ; -105,-10 -84,-10 ; -105,-9 -84,-9 ; -105,-8 -84,-8 ; -105,-7 -84,-7 ; -105,14 -84,14 ; -105,15 -84,15 ; -105,16 -84,16 ; -105,17 -84,17 ; -105,18 -84,18 ; -105,19 -84,19 ; -105,20 -84,20 ; -105,21 -84,21 ; -104,-20 -84,-20 ; -104,-19 -84,-19 ; -104,-18 -84,-18 ; -104,-17 -84,-17 ; -104,-16 -84,-16 ; -104,-15 -84,-15 ; -104,22 -84,22 ; -104,23 -84,23 ; -104,24 -84,24 ; -104,25 -84,25 ; -103,-23 -84,-23 ; -103,-22 -84,-22 ; -103,-21 -84,-21 ; -103,26 -84,26 ; -103,27 -84,27 ; -103,28 -84,28 ; -103,29 -84,29 ; -103,30 -84,30 ; -102,-28 -84,-28 ; -102,-27 -84,-27 ; -102,-26 -84,-26 ; -102,-25 -84,-25 ; -102,-24 -84,-24 ; -102,31 -84,31 ; -102,32 -84,32 ; -102,33 -84,33 ; -101,-30 -84,-30 ; -101,-29 -84,-29 ; -101,34 -84,34 ; -101,35 -84,35 ; -101,36 -84,36 ; -101,37 -84,37 ; -100,-33 -84,-33 ; -100,-32 -84,-32 ; -100,-31 -84,-31 ; -100,38 -84,38 ; -100,39 -84,39 ; -100,40 -84,40 ; -99,-36 -84,-36 ; -99,-35 -84,-35 ; -99,-34 -84,-34 ; -99,41 -84,41 ; -99,42 -84,42 ; -99,43 -84,43 ; -98,-38 -84,-38 ; -98,-37 -84,-37 ; -98,44 -84,44 ; -98,45 -84,45 ; -97,-41 -84,-41 ; -97,-40 -84,-40 ; -97,-39 -84,-39 ; -97,46 -84,46 ; -97,47 -84,47 ; -96,-42 -84,-42 ; -96,48 -84,48 ; -96,49 -84,49 ; -95,-45 -84,-45 ; -95,-44 -84,-44 ; -95,-43 -84,-43 ; -95,50 -86,50 ; -95,51 -86,51 ; -94,-47 -84,-47 ; -94,-46 -84,-46 ; -94,52 -89,52 ; -94,53 -91,53 ; -94,54 -93,54 ; -93,-49 -81,-49 ; -93,-48 -82,-48 ; -92,-50 -79,-50 ; -91,-52 -75,-52 ; -91,-51 -77,-51 ; -90,-54 -72,-54 ; -90,-53 -74,-53 ; -89,-55 -70,-55 ; -89,61 -71,61 ; -89,62 -69,62 ; -88,-57 -67,-57 ; -88,-56 -68,-56 ; -88,63 -67,63 ; -88,64 -66,64 ; -87,-58 -65,-58 ; -87,60 -73,60 ; -87,65 -64,65 ; -86,-60 -62,-60 ; -86,-59 -63,-59 ; -86,66 -62,66 ; -86,67 -61,67 ; -85,-61 -60,-61 ; -85,59 -75,59 ; -85,68 -59,68 ; -84,-62 -59,-62 ; -84,58 -76,58 ; -84,69 -57,69 ; -83,-64 -23,-64 ; -83,-63 -23,-63 ; -83,70 -55,70 ; -83,71 32,71 ; -82,-65 -23,-65 ; -82,57 -78,57 ; -82,72 31,72 ; -81,-66 -23,-66 ; -81,73 29,73 ; -80,-67 -23,-67 ; -80,74 28,74 ; -79,-68 -23,-68 ; -79,75 26,75 ; -78,-70 -23,-70 ; -78,-69 -23,-69 ; -78,76 24,76 ; -78,77 22,77 ; -77,-71 -23,-71 ; -77,78 20,78 ; -76,-72 -23,-72 ; -76,79 17,79 ; -75,-73 -23,-73 ; -75,80 -14,80 ; -74,-74 -23,-74 ; -74,81 -15,81 ; -73,-75 -23,-75 ; -73,82 -17,82 ; -72,-76 -23,-76 ; -72,83 -19,83 ; -71,-77 -23,-77 ; -71,84 -21,84 ; -70,-78 -23,-78 ; -70,-12 -16,-12 ; -70,-11 -17,-11 ; -70,-10 -17,-10 ; -70,-9 -18,-9 ; -70,-8 -18,-8 ; -70,-7 -19,-7 ; -70,-6 -20,-6 ; -70,-5 -20,-5 ; -70,85 -22,85 ; -69,-18 -14,-18 ; -69,-17 -14,-17 ; -69,-16 -14,-16 ; -69,-15 -15,-15 ; -69,-14 -15,-14 ; -69,-13 -16,-13 ; -69,-4 -21,-4 ; -69,-3 -22,-3 ; -69,-2 -22,-2 ; -69,-1 -23,-1 ; -68,-79 -23,-79 ; -68,-22 -12,-22 ; -68,-21 -12,-21 ; -68,-20 -13,-20 ; -68,-19 -13,-19 ; -68,0 -24,0 ; -68,1 -25,1 ; -68,2 -26,2 ; -68,3 -27,3 ; -68,86 -24,86 ; -67,-80 -23,-80 ; -67,-25 -12,-25 ; -67,-24 -12,-24 ; -67,-23 -12,-23 ; -67,4 -28,4 ; -67,87 -25,87 ; -66,-81 -23,-81 ; -66,-28 -11,-28 ; -66,-27 -11,-27 ; -66,-26 -11,-26 ; -66,5 -29,5 ; -66,6 -30,6 ; -66,88 -24,88 ; -65,-82 -23,-82 ; -65,-30 -11,-30 ; -65,-29 -11,-29 ; -65,7 -31,7 ; -65,89 -22,89 ; -64,-83 -22,-83 ; -64,-32 -11,-32 ; -64,-31 -11,-31 ; -64,8 -33,8 ; -64,90 -21,90 ; -63,-34 -11,-34 ; -63,-33 -11,-33 ; -63,9 -34,9 ; -62,-84 -20,-84 ; -62,-36 -11,-36 ; -62,-35 -11,-35 ; -62,10 -36,10 ; -62,11 -37,11 ; -62,91 -19,91 ; -61,-85 -18,-85 ; -61,-37 -11,-37 ; -61,92 -17,92 ; -60,-38 -11,-38 ; -60,12 -40,12 ; -59,-86 -17,-86 ; -59,-40 -11,-40 ; -59,-39 -11,-39 ; -59,93 -16,93 ; -58,-87 -15,-87 ; -58,-41 -11,-41 ; -58,13 -42,13 ; -58,94 -14,94 ; -57,-88 -13,-88 ; -57,-62 -23,-62 ; -57,-61 -23,-61 ; -57,-60 -23,-60 ; -57,-59 -23,-59 ; -57,-58 -23,-58 ; -57,-57 -23,-57 ; -57,-56 -23,-56 ; -57,-55 -21,-55 ; -57,-54 -19,-54 ; -57,-53 -18,-53 ; -57,-52 -17,-52 ; -57,-51 -16,-51 ; -57,-50 -15,-50 ; -57,-49 -15,-49 ; -57,-48 -14,-48 ; -57,-47 -14,-47 ; -57,-46 -13,-46 ; -57,-45 -13,-45 ; -57,-44 -12,-44 ; -57,-43 -12,-43 ; -57,-42 -12,-42 ; -56,95 -12,95 ; -55,-89 -11,-89 ; -55,14 -46,14 ; -55,96 -10,96 ; -53,-90 -10,-90 ; -53,70 33,70 ; -53,97 -9,97 ; -52,-91 -8,-91 ; -52,98 -7,98 ; -51,69 34,69 ; -50,-92 -6,-92 ; -50,99 -5,99 ; -49,68 35,68 ; -48,-93 -4,-93 ; -48,100 -3,100 ; -47,67 36,67 ; -46,-94 -3,-94 ; -46,66 36,66 ; -46,101 -2,101 ; -44,-95 -1,-95 ; -44,65 37,65 ; -44,102 0,102 ; -42,-96 0,-96 ; -42,64 37,64 ; -42,103 2,103 ; -40,-97 -1,-97 ; -40,63 38,63 ; -40,104 46,104 ; -39,62 38,62 ; -38,51 39,51 ; -38,52 39,52 ; -38,53 39,53 ; -38,54 40,54 ; -38,55 40,55 ; -38,56 40,56 ; -38,57 40,57 ; -38,58 39,58 ; -38,59 39,59 ; -38,105 44,105 ; -37,-98 0,-98 ; -37,49 38,49 ; -37,50 39,50 ; -37,60 39,60 ; -37,61 39,61 ; -36,47 38,47 ; -36,48 38,48 ; -35,-99 -1,-99 ; -35,45 36,45 ; -35,46 37,46 ; -35,106 42,106 ; -34,44 36,44 ; -33,43 35,43 ; -32,-100 -1,-100 ; -32,42 34,42 ; -32,107 39,107 ; -31,41 33,41 ; -30,40 32,40 ; -29,-101 -1,-101 ; -29,39 31,39 ; -29,108 35,108 ; -28,38 30,38 ; -26,37 28,37 ; -25,-102 -1,-102 ; -25,36 26,36 ; -25,109 32,109 ; -23,35 25,35 ; -22,-103 -1,-103 ; -22,110 28,110 ; -21,34 22,34 ; -19,33 20,33 ; -17,111 23,111 ; -16,-104 -1,-104 ; -16,32 17,32 ; -12,31 14,31 ; -12,80 13,80 ; -10,112 17,112 ; -9,-105 -1,-105 ; -6,30 7,30 ; -6,81 6,81 ; 5,103 49,103 ; 6,102 51,102 ; 7,-105 18,-105 ; 7,-104 24,-104 ; 7,-103 29,-103 ; 7,-102 33,-102 ; 7,-101 36,-101 ; 7,-100 39,-100 ; 7,-99 42,-99 ; 7,-98 45,-98 ; 7,-97 47,-97 ; 7,-96 49,-96 ; 7,-95 51,-95 ; 8,101 53,101 ; 9,-94 53,-94 ; 10,-93 55,-93 ; 10,100 55,100 ; 12,-92 57,-92 ; 12,99 56,99 ; 13,98 58,98 ; 14,-91 59,-91 ; 15,97 60,97 ; 16,-90 60,-90 ; 17,-89 62,-89 ; 17,96 61,96 ; 18,-39 67,-39 ; 18,-38 68,-38 ; 18,-37 69,-37 ; 18,-36 69,-36 ; 18,-35 70,-35 ; 18,-34 70,-34 ; 18,-33 71,-33 ; 18,-32 72,-32 ; 18,-31 72,-31 ; 18,-30 73,-30 ; 18,-29 73,-29 ; 18,-28 73,-28 ; 19,-88 63,-88 ; 19,-43 64,-43 ; 19,-42 65,-42 ; 19,-41 66,-41 ; 19,-40 66,-40 ; 19,-27 74,-27 ; 19,-26 74,-26 ; 19,-25 75,-25 ; 19,-24 75,-24 ; 19,-23 75,-23 ; 19,95 63,95 ; 20,-45 62,-45 ; 20,-44 63,-44 ; 20,-22 76,-22 ; 20,-21 77,-21 ; 20,-20 79,-20 ; 20,94 64,94 ; 21,-87 65,-87 ; 21,-47 60,-47 ; 21,-46 61,-46 ; 21,-19 81,-19 ; 21,-18 82,-18 ; 21,-17 84,-17 ; 22,-49 58,-49 ; 22,-48 59,-48 ; 22,-16 86,-16 ; 22,-15 88,-15 ; 22,93 66,93 ; 23,-86 66,-86 ; 23,-50 57,-50 ; 23,-14 89,-14 ; 23,-13 112,-13 ; 23,-12 112,-12 ; 24,-85 68,-85 ; 24,-51 55,-51 ; 24,-11 112,-11 ; 24,-10 112,-10 ; 24,92 67,92 ; 25,-52 54,-52 ; 25,-9 112,-9 ; 26,-84 69,-84 ; 26,-53 52,-53 ; 26,-8 112,-8 ; 26,-7 112,-7 ; 26,91 69,91 ; 27,-54 50,-54 ; 27,-6 112,-6 ; 27,-5 112,-5 ; 27,90 70,90 ; 28,-83 70,-83 ; 28,-4 113,-4 ; 29,-82 72,-82 ; 29,-55 48,-55 ; 29,-3 113,-3 ; 29,89 71,89 ; 30,-2 113,-2 ; 30,-1 113,-1 ; 31,-81 73,-81 ; 31,-56 46,-56 ; 31,0 113,0 ; 31,88 73,88 ; 32,1 113,1 ; 33,-80 74,-80 ; 33,2 113,2 ; 33,87 74,87 ; 34,-57 42,-57 ; 34,3 113,3 ; 34,86 75,86 ; 35,-79 75,-79 ; 35,4 113,4 ; 36,-78 76,-78 ; 36,5 113,5 ; 36,85 76,85 ; 37,6 113,6 ; 38,-77 78,-77 ; 38,7 113,7 ; 38,84 77,84 ; 39,83 78,83 ; 40,-76 79,-76 ; 40,8 113,8 ; 41,9 72,9 ; 41,82 79,82 ; 42,-75 80,-75 ; 42,10 71,10 ; 43,-74 81,-74 ; 43,81 80,81 ; 44,11 70,11 ; 45,-73 82,-73 ; 45,80 81,80 ; 46,12 68,12 ; 46,79 82,79 ; 47,-72 83,-72 ; 48,13 66,13 ; 48,78 83,78 ; 49,-71 84,-71 ; 50,-70 84,-70 ; 50,77 84,77 ; 52,-69 85,-69 ; 52,14 64,14 ; 52,76 85,76 ; 53,75 86,75 ; 54,-68 86,-68 ; 55,74 87,74 ; 56,-67 87,-67 ; 57,-66 88,-66 ; 57,73 88,73 ; 58,72 88,72 ; 59,-65 89,-65 ; 60,71 89,71 ; 61,-64 90,-64 ; 62,-63 90,-63 ; 62,70 90,70 ; 64,-62 91,-62 ; 64,69 91,69 ; 65,68 91,68 ; 66,-61 92,-61 ; 67,67 92,67 ; 68,-60 93,-60 ; 69,-59 93,-59 ; 69,66 93,66 ; 71,-58 94,-58 ; 71,65 94,65 ; 72,64 94,64 ; 73,-57 95,-57 ; 73,9 113,9 ; 74,10 113,10 ; 74,63 95,63 ; 75,-56 95,-56 ; 76,-55 96,-55 ; 76,11 113,11 ; 76,62 96,62 ; 77,61 96,61 ; 78,-54 96,-54 ; 78,12 112,12 ; 79,60 94,60 ; 80,-53 97,-53 ; 80,13 112,13 ; 81,59 92,59 ; 82,-52 98,-52 ; 82,14 112,14 ; 83,-51 98,-51 ; 83,15 112,15 ; 83,58 90,58 ; 84,57 89,57 ; 85,-50 99,-50 ; 85,16 112,16 ; 86,56 87,56 ; 87,-49 99,-49 ; 87,17 112,17 ; 88,-48 100,-48 ; 89,18 112,18 ; 90,-47 100,-47 ; 90,-46 101,-46 ; 90,-45 101,-45 ; 90,-44 102,-44 ; 90,-43 102,-43 ; 90,-42 103,-42 ; 90,-41 103,-41 ; 90,-40 104,-40 ; 90,-39 104,-39 ; 90,-38 105,-38 ; 90,-37 105,-37 ; 90,-36 105,-36 ; 90,-35 106,-35 ; 90,-34 106,-34 ; 90,-33 106,-33 ; 90,-32 107,-32 ; 90,-31 107,-31 ; 90,-30 108,-30 ; 90,-29 108,-29 ; 90,-28 108,-28 ; 90,-27 108,-27 ; 90,-26 109,-26 ; 90,-25 109,-25 ; 90,-24 109,-24 ; 90,-23 109,-23 ; 90,-22 110,-22 ; 90,-21 110,-21 ; 90,-20 110,-20 ; 90,-19 110,-19 ; 90,-18 111,-18 ; 90,-17 111,-17 ; 90,-16 111,-16 ; 90,-15 111,-15 ; 90,-14 111,-14 ; 90,19 112,19 ; 90,20 111,20 ; 90,21 111,21 ; 90,22 111,22 ; 90,23 111,23 ; 90,24 111,24 ; 90,25 111,25 ; 90,26 110,26 ; 90,27 110,27 ; 90,28 110,28 ; 90,29 110,29 ; 90,30 109,30 ; 90,31 109,31 ; 90,32 109,32 ; 90,33 109,33 ; 90,34 108,34 ; 90,35 108,35 ; 90,36 108,36 ; 90,37 107,37 ; 90,38 107,38 ; 90,39 107,39 ; 90,40 106,40 ; 90,41 106,41 ; 90,42 106,42 ; 90,43 105,43 ; 90,44 105,44 ; 90,45 104,45 ; 90,46 104,46 ; 90,47 104,47 ; 90,48 103,48 ; 90,49 103,49 ; 91,50 102,50 ; 93,51 102,51 ; 95,52 101,52 ; 97,53 101,53 ; 98,54 100,54

## LOGO-HL [mil] "Half Life Logo, 300 mil"
Top Overlay:
  drawing of 777 lines, arcs and shapes, not listed